# Altium footprint library LukaLIBRARY.PcbLib: 772 footprints (part 12 of 49)
Each footprint in its own frame and in the unit in brackets; x right, y up, seen from the top. Pads: shape width x height; smd on the part's side, far side on the other; paste and mask are expansions set on the pad; w line width, h text height; cw(c..) or ccw(c..) is an arc to the next point about the centre after c.
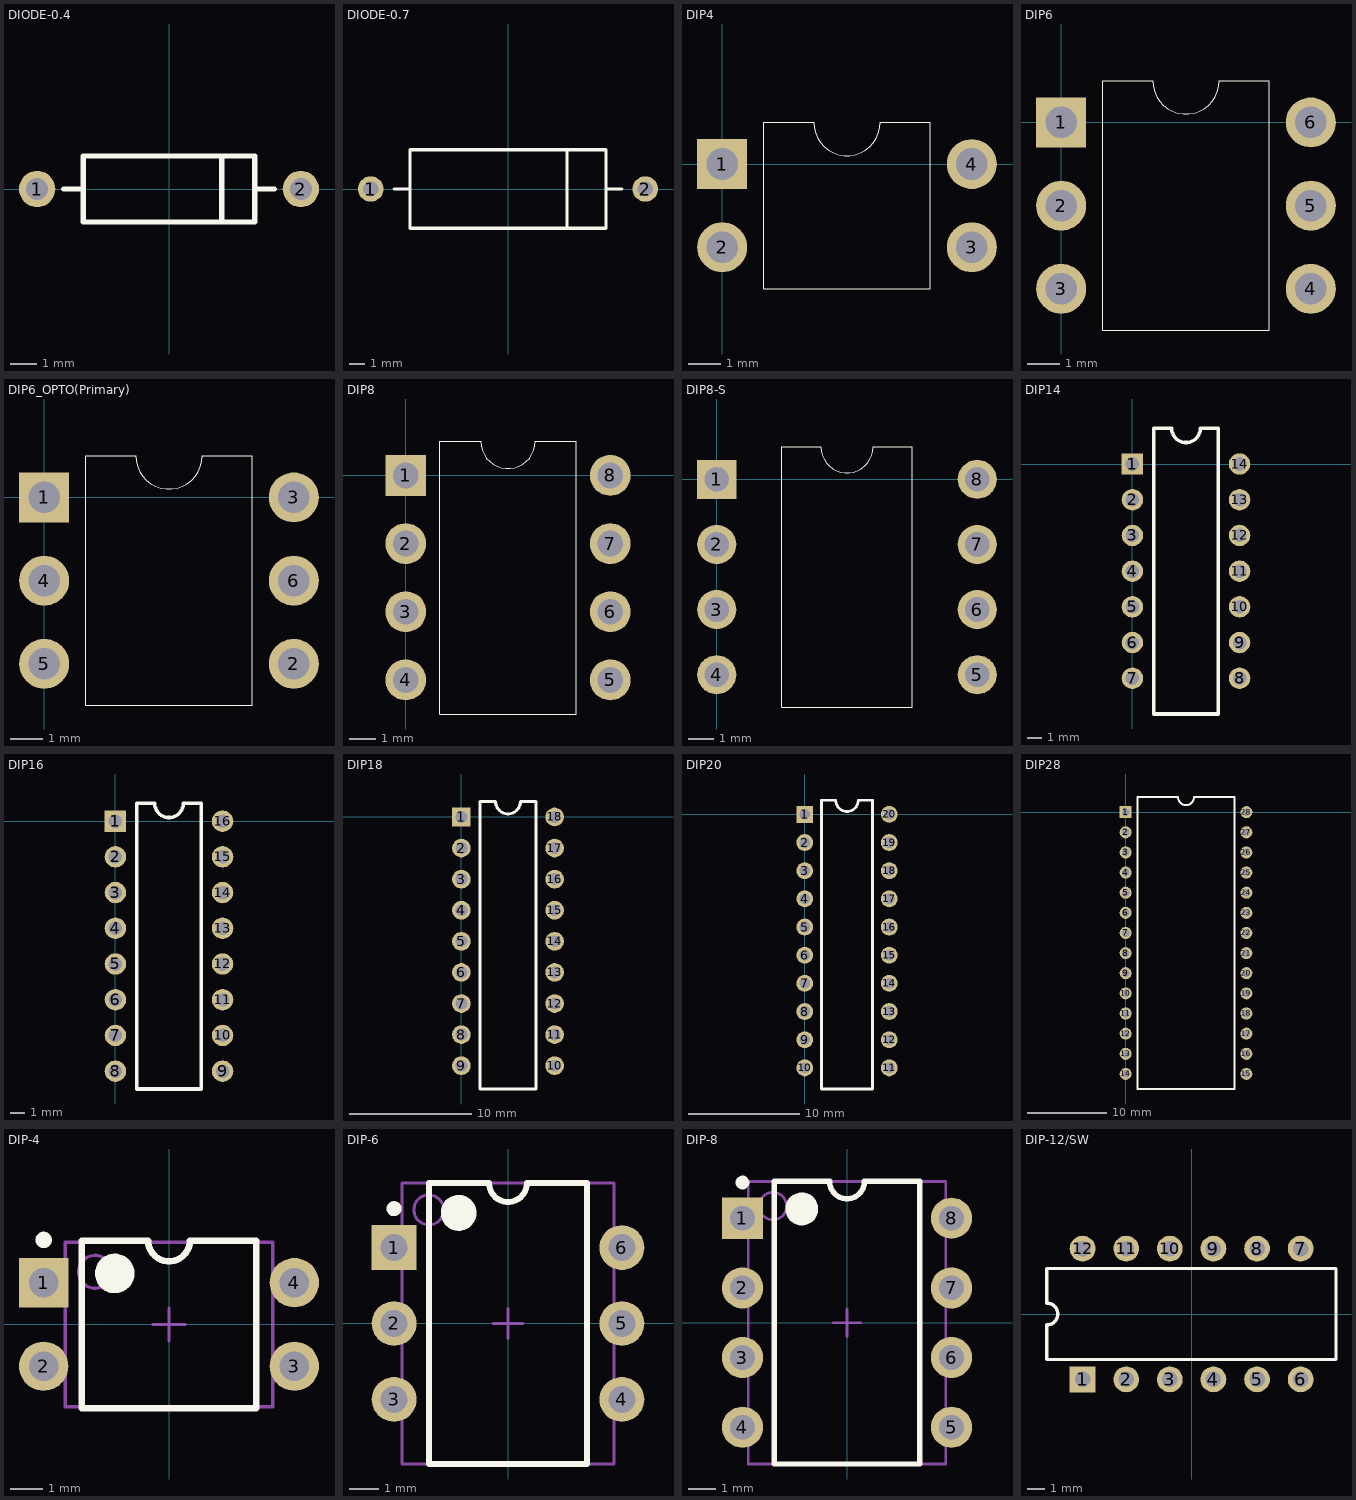
[diagram p11: the footprints below, top view; thin cyan lines are the x and y axes]

## DIODE-0.4 [mm] "Diode, Thru-Hole; 2 Leads; 0.4 in Pin Spacing"
height 2.54
pads (2):
  round 1.4 hole 0.85: 1(-5.08,0) 2(5.08,0)
Top Overlay:
  lines w0.2: -4.064,0 -3.302,0 ; 2.032,-1.27 2.032,1.27 ; 3.302,0 4.064,0 ; -3.302,-1.27 3.302,-1.27 3.302,1.27 -3.302,1.27 -3.302,-1.27

## DIODE-0.7 [mm] "Diode, Thru-Hole; 2 Leads; 0.7 in Pin Spacing"
height 5.08
pads (2):
  round 1.65 hole 1: 1(-8.89,0) 2(8.89,0)
Top Overlay:
  lines w0.2: -7.366,0 -6.35,0 ; 3.81,-2.54 3.81,2.54 ; 6.35,0 7.366,0 ; -6.35,-2.54 6.35,-2.54 6.35,2.54 -6.35,2.54 -6.35,-2.54

## DIP4 [mil]
pads (4):
  rect 60x60 hole 38 mask-1000: 1(0,0)
  round 60 hole 38 mask-1000: 2(0,-100) 3(300,-100) 4(300,0)
Top Overlay:
  lines w1: 50,-150 50,50 110,50 ccw(c150,50) 190,50 250,50 250,-150 50,-150
Top Solder:
  region: -30,-30 30,-30 30,30 -30,30
  region: 300,30.26 292.17,29.23 284.87,26.2 278.6,21.4 273.8,15.13 270.77,7.83 269.74,0 270.77,-7.83 273.8,-15.13 278.6,-21.4 284.87,-26.2 292.17,-29.23 300,-30.26 307.83,-29.23 315.13,-26.2 321.4,-21.4 326.2,-15.13 329.23,-7.83 330.26,0 329.23,7.83 326.2,15.13 321.4,21.4 315.13,26.2 307.83,29.23
  region: 0,-69.74 -7.83,-70.77 -15.13,-73.8 -21.4,-78.6 -26.2,-84.87 -29.23,-92.17 -30.26,-100 -29.23,-107.83 -26.2,-115.13 -21.4,-121.4 -15.13,-126.2 -7.83,-129.23 0,-130.26 7.83,-129.23 15.13,-126.2 21.4,-121.4 26.2,-115.13 29.23,-107.83 30.26,-100 29.23,-92.17 26.2,-84.87 21.4,-78.6 15.13,-73.8 7.83,-70.77
  region: 300,-69.74 292.17,-70.77 284.87,-73.8 278.6,-78.6 273.8,-84.87 270.77,-92.17 269.74,-100 270.77,-107.83 273.8,-115.13 278.6,-121.4 284.87,-126.2 292.17,-129.23 300,-130.26 307.83,-129.23 315.13,-126.2 321.4,-121.4 326.2,-115.13 329.23,-107.83 330.26,-100 329.23,-92.17 326.2,-84.87 321.4,-78.6 315.13,-73.8 307.83,-70.77
Bottom Solder:
  region: -30,-30 30,-30 30,30 -30,30
  region: 300,30.26 292.17,29.23 284.87,26.2 278.6,21.4 273.8,15.13 270.77,7.83 269.74,0 270.77,-7.83 273.8,-15.13 278.6,-21.4 284.87,-26.2 292.17,-29.23 300,-30.26 307.83,-29.23 315.13,-26.2 321.4,-21.4 326.2,-15.13 329.23,-7.83 330.26,0 329.23,7.83 326.2,15.13 321.4,21.4 315.13,26.2 307.83,29.23
  region: 0,-69.74 -7.83,-70.77 -15.13,-73.8 -21.4,-78.6 -26.2,-84.87 -29.23,-92.17 -30.26,-100 -29.23,-107.83 -26.2,-115.13 -21.4,-121.4 -15.13,-126.2 -7.83,-129.23 0,-130.26 7.83,-129.23 15.13,-126.2 21.4,-121.4 26.2,-115.13 29.23,-107.83 30.26,-100 29.23,-92.17 26.2,-84.87 21.4,-78.6 15.13,-73.8 7.83,-70.77
  region: 300,-69.74 292.17,-70.77 284.87,-73.8 278.6,-78.6 273.8,-84.87 270.77,-92.17 269.74,-100 270.77,-107.83 273.8,-115.13 278.6,-121.4 284.87,-126.2 292.17,-129.23 300,-130.26 307.83,-129.23 315.13,-126.2 321.4,-121.4 326.2,-115.13 329.23,-107.83 330.26,-100 329.23,-92.17 326.2,-84.87 321.4,-78.6 315.13,-73.8 307.83,-70.77

## DIP6 [mil]
pads (6):
  rect 60x60 hole 38 mask-1000: 1(0,0)
  round 60 hole 38 mask-1000: 2(0,-100) 3(0,-200) 4(300,-200) 5(300,-100) 6(300,0)
Top Overlay:
  lines w1: 50,-250 250,-250 250,50 190,50 cw(c150,50) 110,50 50,50 50,-250
Top Solder:
  region: 300,-69.74 292.17,-70.77 284.87,-73.8 278.6,-78.6 273.8,-84.87 270.77,-92.17 269.74,-100 270.77,-107.83 273.8,-115.13 278.6,-121.4 284.87,-126.2 292.17,-129.23 300,-130.26 307.83,-129.23 315.13,-126.2 321.4,-121.4 326.2,-115.13 329.23,-107.83 330.26,-100 329.23,-92.17 326.2,-84.87 321.4,-78.6 315.13,-73.8 307.83,-70.77
  region: 0,-69.74 -7.83,-70.77 -15.13,-73.8 -21.4,-78.6 -26.2,-84.87 -29.23,-92.17 -30.26,-100 -29.23,-107.83 -26.2,-115.13 -21.4,-121.4 -15.13,-126.2 -7.83,-129.23 0,-130.26 7.83,-129.23 15.13,-126.2 21.4,-121.4 26.2,-115.13 29.23,-107.83 30.26,-100 29.23,-92.17 26.2,-84.87 21.4,-78.6 15.13,-73.8 7.83,-70.77
  region: 300,30.26 292.17,29.23 284.87,26.2 278.6,21.4 273.8,15.13 270.77,7.83 269.74,0 270.77,-7.83 273.8,-15.13 278.6,-21.4 284.87,-26.2 292.17,-29.23 300,-30.26 307.83,-29.23 315.13,-26.2 321.4,-21.4 326.2,-15.13 329.23,-7.83 330.26,0 329.23,7.83 326.2,15.13 321.4,21.4 315.13,26.2 307.83,29.23
  region: 300,-169.74 292.17,-170.77 284.87,-173.79 278.6,-178.6 273.8,-184.87 270.77,-192.17 269.74,-200 270.77,-207.83 273.8,-215.13 278.6,-221.4 284.87,-226.21 292.17,-229.23 300,-230.26 307.83,-229.23 315.13,-226.21 321.4,-221.4 326.2,-215.13 329.23,-207.83 330.26,-200 329.23,-192.17 326.2,-184.87 321.4,-178.6 315.13,-173.79 307.83,-170.77
  region: -30,-30 30,-30 30,30 -30,30
  region: 0,-169.74 -7.83,-170.77 -15.13,-173.79 -21.4,-178.6 -26.2,-184.87 -29.23,-192.17 -30.26,-200 -29.23,-207.83 -26.2,-215.13 -21.4,-221.4 -15.13,-226.21 -7.83,-229.23 0,-230.26 7.83,-229.23 15.13,-226.21 21.4,-221.4 26.2,-215.13 29.23,-207.83 30.26,-200 29.23,-192.17 26.2,-184.87 21.4,-178.6 15.13,-173.79 7.83,-170.77
Bottom Solder:
  region: 300,-69.74 292.17,-70.77 284.87,-73.8 278.6,-78.6 273.8,-84.87 270.77,-92.17 269.74,-100 270.77,-107.83 273.8,-115.13 278.6,-121.4 284.87,-126.2 292.17,-129.23 300,-130.26 307.83,-129.23 315.13,-126.2 321.4,-121.4 326.2,-115.13 329.23,-107.83 330.26,-100 329.23,-92.17 326.2,-84.87 321.4,-78.6 315.13,-73.8 307.83,-70.77
  region: 0,-69.74 -7.83,-70.77 -15.13,-73.8 -21.4,-78.6 -26.2,-84.87 -29.23,-92.17 -30.26,-100 -29.23,-107.83 -26.2,-115.13 -21.4,-121.4 -15.13,-126.2 -7.83,-129.23 0,-130.26 7.83,-129.23 15.13,-126.2 21.4,-121.4 26.2,-115.13 29.23,-107.83 30.26,-100 29.23,-92.17 26.2,-84.87 21.4,-78.6 15.13,-73.8 7.83,-70.77
  region: 300,30.26 292.17,29.23 284.87,26.2 278.6,21.4 273.8,15.13 270.77,7.83 269.74,0 270.77,-7.83 273.8,-15.13 278.6,-21.4 284.87,-26.2 292.17,-29.23 300,-30.26 307.83,-29.23 315.13,-26.2 321.4,-21.4 326.2,-15.13 329.23,-7.83 330.26,0 329.23,7.83 326.2,15.13 321.4,21.4 315.13,26.2 307.83,29.23
  region: 300,-169.74 292.17,-170.77 284.87,-173.79 278.6,-178.6 273.8,-184.87 270.77,-192.17 269.74,-200 270.77,-207.83 273.8,-215.13 278.6,-221.4 284.87,-226.21 292.17,-229.23 300,-230.26 307.83,-229.23 315.13,-226.21 321.4,-221.4 326.2,-215.13 329.23,-207.83 330.26,-200 329.23,-192.17 326.2,-184.87 321.4,-178.6 315.13,-173.79 307.83,-170.77
  region: -30,-30 30,-30 30,30 -30,30
  region: 0,-169.74 -7.83,-170.77 -15.13,-173.79 -21.4,-178.6 -26.2,-184.87 -29.23,-192.17 -30.26,-200 -29.23,-207.83 -26.2,-215.13 -21.4,-221.4 -15.13,-226.21 -7.83,-229.23 0,-230.26 7.83,-229.23 15.13,-226.21 21.4,-221.4 26.2,-215.13 29.23,-207.83 30.26,-200 29.23,-192.17 26.2,-184.87 21.4,-178.6 15.13,-173.79 7.83,-170.77

## DIP6_OPTO(Primary) [mil]
pads (6):
  rect 60x60 hole 38 mask-1000: 1(0,0)
  round 60 hole 38 mask-1000: 2(300,-200) 3(300,0) 4(0,-100) 5(0,-200) 6(300,-100)
Top Overlay:
  lines w1: 50,-250 50,50 110,50 ccw(c150,50) 190,50 250,50 250,-250 50,-250
Top Solder:
  region: 0,-169.74 -7.83,-170.77 -15.13,-173.79 -21.4,-178.6 -26.2,-184.87 -29.23,-192.17 -30.26,-200 -29.23,-207.83 -26.2,-215.13 -21.4,-221.4 -15.13,-226.21 -7.83,-229.23 0,-230.26 7.83,-229.23 15.13,-226.21 21.4,-221.4 26.2,-215.13 29.23,-207.83 30.26,-200 29.23,-192.17 26.2,-184.87 21.4,-178.6 15.13,-173.79 7.83,-170.77
  region: -30,-30 30,-30 30,30 -30,30
  region: 300,-169.74 292.17,-170.77 284.87,-173.79 278.6,-178.6 273.8,-184.87 270.77,-192.17 269.74,-200 270.77,-207.83 273.8,-215.13 278.6,-221.4 284.87,-226.21 292.17,-229.23 300,-230.26 307.83,-229.23 315.13,-226.21 321.4,-221.4 326.2,-215.13 329.23,-207.83 330.26,-200 329.23,-192.17 326.2,-184.87 321.4,-178.6 315.13,-173.79 307.83,-170.77
  region: 300,30.26 292.17,29.23 284.87,26.2 278.6,21.4 273.8,15.13 270.77,7.83 269.74,0 270.77,-7.83 273.8,-15.13 278.6,-21.4 284.87,-26.2 292.17,-29.23 300,-30.26 307.83,-29.23 315.13,-26.2 321.4,-21.4 326.2,-15.13 329.23,-7.83 330.26,0 329.23,7.83 326.2,15.13 321.4,21.4 315.13,26.2 307.83,29.23
  region: 0,-69.74 -7.83,-70.77 -15.13,-73.8 -21.4,-78.6 -26.2,-84.87 -29.23,-92.17 -30.26,-100 -29.23,-107.83 -26.2,-115.13 -21.4,-121.4 -15.13,-126.2 -7.83,-129.23 0,-130.26 7.83,-129.23 15.13,-126.2 21.4,-121.4 26.2,-115.13 29.23,-107.83 30.26,-100 29.23,-92.17 26.2,-84.87 21.4,-78.6 15.13,-73.8 7.83,-70.77
  region: 300,-69.74 292.17,-70.77 284.87,-73.8 278.6,-78.6 273.8,-84.87 270.77,-92.17 269.74,-100 270.77,-107.83 273.8,-115.13 278.6,-121.4 284.87,-126.2 292.17,-129.23 300,-130.26 307.83,-129.23 315.13,-126.2 321.4,-121.4 326.2,-115.13 329.23,-107.83 330.26,-100 329.23,-92.17 326.2,-84.87 321.4,-78.6 315.13,-73.8 307.83,-70.77
Bottom Solder:
  region: 0,-169.74 -7.83,-170.77 -15.13,-173.79 -21.4,-178.6 -26.2,-184.87 -29.23,-192.17 -30.26,-200 -29.23,-207.83 -26.2,-215.13 -21.4,-221.4 -15.13,-226.21 -7.83,-229.23 0,-230.26 7.83,-229.23 15.13,-226.21 21.4,-221.4 26.2,-215.13 29.23,-207.83 30.26,-200 29.23,-192.17 26.2,-184.87 21.4,-178.6 15.13,-173.79 7.83,-170.77
  region: -30,-30 30,-30 30,30 -30,30
  region: 300,-169.74 292.17,-170.77 284.87,-173.79 278.6,-178.6 273.8,-184.87 270.77,-192.17 269.74,-200 270.77,-207.83 273.8,-215.13 278.6,-221.4 284.87,-226.21 292.17,-229.23 300,-230.26 307.83,-229.23 315.13,-226.21 321.4,-221.4 326.2,-215.13 329.23,-207.83 330.26,-200 329.23,-192.17 326.2,-184.87 321.4,-178.6 315.13,-173.79 307.83,-170.77
  region: 300,30.26 292.17,29.23 284.87,26.2 278.6,21.4 273.8,15.13 270.77,7.83 269.74,0 270.77,-7.83 273.8,-15.13 278.6,-21.4 284.87,-26.2 292.17,-29.23 300,-30.26 307.83,-29.23 315.13,-26.2 321.4,-21.4 326.2,-15.13 329.23,-7.83 330.26,0 329.23,7.83 326.2,15.13 321.4,21.4 315.13,26.2 307.83,29.23
  region: 0,-69.74 -7.83,-70.77 -15.13,-73.8 -21.4,-78.6 -26.2,-84.87 -29.23,-92.17 -30.26,-100 -29.23,-107.83 -26.2,-115.13 -21.4,-121.4 -15.13,-126.2 -7.83,-129.23 0,-130.26 7.83,-129.23 15.13,-126.2 21.4,-121.4 26.2,-115.13 29.23,-107.83 30.26,-100 29.23,-92.17 26.2,-84.87 21.4,-78.6 15.13,-73.8 7.83,-70.77
  region: 300,-69.74 292.17,-70.77 284.87,-73.8 278.6,-78.6 273.8,-84.87 270.77,-92.17 269.74,-100 270.77,-107.83 273.8,-115.13 278.6,-121.4 284.87,-126.2 292.17,-129.23 300,-130.26 307.83,-129.23 315.13,-126.2 321.4,-121.4 326.2,-115.13 329.23,-107.83 330.26,-100 329.23,-92.17 326.2,-84.87 321.4,-78.6 315.13,-73.8 307.83,-70.77

## DIP8 [mil]
pads (8):
  rect 60x60 hole 38 mask-1000: 1(0,0)
  round 60 hole 38 mask-1000: 2(0,-100) 3(0,-200) 4(0,-300) 5(300,-300) 6(300,-200) 7(300,-100) 8(300,0)
Top Overlay:
  lines w1: 50,-350 250,-350 250,50 190,50 cw(c150,50) 110,50 50,50 50,-350
Top Solder:
  drawing of 8 lines, arcs and shapes, not listed
Bottom Solder:
  drawing of 8 lines, arcs and shapes, not listed

## DIP8-S [mil]
pads (8):
  rect 60x60 hole 38 mask-1000: 1(0,0)
  round 60 hole 38 mask-1000: 2(0,-100) 3(0,-200) 4(0,-300) 5(400,-300) 6(400,-200) 7(400,-100) 8(400,0)
Top Overlay:
  lines w1: 100,-350 100,50 160,50 ccw(c200,50) 240,50 300,50 300,-350 100,-350
Top Solder:
  drawing of 8 lines, arcs and shapes, not listed
Bottom Solder:
  drawing of 8 lines, arcs and shapes, not listed

## DIP14 [mil]
pads (14):
  rect 60x60 hole 38 mask-1000: 1(0,0)
  round 60 hole 38 mask-1000: 2(0,-100) 3(0,-200) 4(0,-300) 5(0,-400) 6(0,-500) 7(0,-600) 8(300,-600) 9(300,-500) 10(300,-400) 11(300,-300) 12(300,-200) 13(300,-100) 14(300,0)
Top Overlay:
  lines w10: 60,-700 240,-700 240,100 190,100 cw(c150,100) 110,100 60,100 60,-700
Top Solder:
  drawing of 14 lines, arcs and shapes, not listed
Bottom Solder:
  drawing of 14 lines, arcs and shapes, not listed

## DIP16 [mil]
pads (16):
  rect 60x60 hole 38 mask-1000: 1(0,0)
  round 60 hole 38 mask-1000: 2(0,-100) 3(0,-200) 4(0,-300) 5(0,-400) 6(0,-500) 7(0,-600) 8(0,-700) 9(300,-700) 10(300,-600) 11(300,-500) 12(300,-400) 13(300,-300) 14(300,-200) 15(300,-100) 16(300,0)
Top Overlay:
  lines w10: 60,-750 240,-750 240,50 190,50 cw(c150,50) 110,50 60,50 60,-750
Top Solder:
  drawing of 16 lines, arcs and shapes, not listed
Bottom Solder:
  drawing of 16 lines, arcs and shapes, not listed

## DIP18 [mil]
pads (18):
  rect 60x60 hole 38 mask-1000: 1(0,0)
  round 60 hole 38 mask-1000: 2(0,-100) 3(0,-200) 4(0,-300) 5(0,-400) 6(0,-500) 7(0,-600) 8(0,-700) 9(0,-800) 10(300,-800) 11(300,-700) 12(300,-600) 13(300,-500) 14(300,-400) 15(300,-300) 16(300,-200) 17(300,-100) 18(300,0)
Top Overlay:
  lines w10: 60,-875 240,-875 240,50 190,50 cw(c150,50) 110,50 60,50 60,-875
Top Solder:
  drawing of 18 lines, arcs and shapes, not listed
Bottom Solder:
  drawing of 18 lines, arcs and shapes, not listed

## DIP20 [mil]
pads (20):
  rect 60x60 hole 38 mask-1000: 1(0,0)
  round 60 hole 38 mask-1000: 2(0,-100) 3(0,-200) 4(0,-300) 5(0,-400) 6(0,-500) 7(0,-600) 8(0,-700) 9(0,-800) 10(0,-900) 11(300,-900) 12(300,-800) 13(300,-700) 14(300,-600) 15(300,-500) 16(300,-400) 17(300,-300) 18(300,-200) 19(300,-100) 20(300,0)
Top Overlay:
  lines w10: 60,-975 240,-975 240,50 190,50 cw(c150,50) 110,50 60,50 60,-975
Top Solder:
  drawing of 20 lines, arcs and shapes, not listed
Bottom Solder:
  drawing of 20 lines, arcs and shapes, not listed

## DIP28 [mil]
pads (28):
  rect 60x60 hole 38 mask-1000: 1(0,0)
  round 60 hole 38 mask-1000: 2(0,-100) 3(0,-200) 4(0,-300) 5(0,-400) 6(0,-500) 7(0,-600) 8(0,-700) 9(0,-800) 10(0,-900) 11(0,-1000) 12(0,-1100) 13(0,-1200) 14(0,-1300) 15(600,-1300) 16(600,-1200) 17(600,-1100) 18(600,-1000) 19(600,-900) 20(600,-800) 21(600,-700) 22(600,-600) 23(600,-500) 24(600,-400) 25(600,-300) 26(600,-200) 27(600,-100) 28(600,0)
Top Overlay:
  lines w10: 60,-1375 540,-1375 540,75 340,75 cw(c300,75) 260,75 60,75 60,-1375
Top Solder:
  drawing of 28 lines, arcs and shapes, not listed
Bottom Solder:
  drawing of 28 lines, arcs and shapes, not listed

## DIP-4 [mm] "DIP; 4 Leads; Row Spacing 7.62 mm; Pitch 2.54 mm"
height 5.6
pads (4):
  rect 1.5x1.5 hole 0.9: 1(-3.81,1.27)
  round 1.5 hole 0.9: 2(-3.81,-1.27) 3(3.81,-1.27) 4(3.81,1.27)
Top Overlay:
  circle w0.6: c-1.65,1.55 r0.3
  circle w0.25: c-3.81,2.57 r0.125
  lines w0.2: -2.65,-2.55 2.65,-2.55 2.65,2.55 0.635,2.55 cw(c0,2.55) -0.635,2.55 -2.65,2.55 -2.65,-2.55
Mechanical 13:
  circle w0.1: c-2.25,1.6 r0.5
  lines w0.1: -3.15,-2.5 3.15,-2.5 3.15,2.5 -3.15,2.5 -3.15,-2.5
Mechanical 15:
  lines w0.1: -0.5,0 0.5,0 ; 0,-0.5 0,0.5
3D body: height 5.6, standoff 0, extent -3.15,-2.5 3.15,2.5

## DIP-6 [mm] "DIP; 6 Leads; Row Spacing 7.62 mm; Pitch 2.54 mm"
height 5.46
pads (6):
  rect 1.5x1.5 hole 0.9: 1(-3.81,2.54)
  round 1.5 hole 0.9: 2(-3.81,0) 3(-3.81,-2.54) 4(3.81,-2.54) 5(3.81,0) 6(3.81,2.54)
Top Overlay:
  circle w0.25: c-3.81,3.84 r0.125
  circle w0.6: c-1.65,3.7 r0.3
  lines w0.2: -2.65,-4.7 -2.65,4.7 -0.635,4.7 ccw(c0,4.7) 0.635,4.7 2.65,4.7 2.65,-4.7 -2.65,-4.7
Mechanical 13:
  circle w0.1: c-2.65,3.8 r0.5
  lines w0.1: -3.55,-4.7 -3.55,4.7 3.55,4.7 3.55,-4.7 -3.55,-4.7
Mechanical 15:
  lines w0.1: -0.5,0 0.5,0 ; 0,-0.5 0,0.5
3D body: height 5.46, standoff 0, extent -3.55,-4.7 3.55,4.7

## DIP-8 [mm] "DIP; 8 Leads; Row Spacing 7.62 mm; Pitch 2.54 mm"
height 5.08
pads (8):
  rect 1.5x1.5 hole 0.9: 1(-3.81,3.81)
  round 1.5 hole 0.9: 2(-3.81,1.27) 3(-3.81,-1.27) 4(-3.81,-3.81) 5(3.81,-3.81) 6(3.81,-1.27) 7(3.81,1.27) 8(3.81,3.81)
Top Overlay:
  circle w0.6: c-1.65,4.15 r0.3
  circle w0.25: c-3.81,5.11 r0.125
  lines w0.2: -2.65,-5.15 2.65,-5.15 2.65,5.15 0.635,5.15 cw(c0,5.15) -0.635,5.15 -2.65,5.15 -2.65,-5.15
Mechanical 13:
  circle w0.1: c-2.7,4.25 r0.5
  lines w0.1: -3.6,-5.15 3.6,-5.15 3.6,5.15 -3.6,5.15 -3.6,-5.15
Mechanical 15:
  lines w0.1: -0.5,0 0.5,0 ; 0,-0.5 0,0.5
3D body: height 5.08, standoff 0, extent -3.6,-5.15 3.6,5.15

## DIP-12/SW [mm] "DIP Switch; 12 Leads"
height 5.8
pads (12):
  rect 1.5x1.5 hole 0.9: 1(-6.35,-3.81)
  round 1.5 hole 0.9: 2(-3.81,-3.81) 3(-1.27,-3.81) 4(1.27,-3.81) 5(3.81,-3.81) 6(6.35,-3.81) 7(6.35,3.81) 8(3.81,3.81) 9(1.27,3.81) 10(-1.27,3.81) 11(-3.81,3.81) 12(-6.35,3.81)
Top Overlay:
  lines w0.2: -8.43,-2.65 8.41,-2.65 8.41,2.65 -8.43,2.65 -8.43,0.635 cw(c-8.43,0) -8.43,-0.635 -8.43,-2.65